# Altium integrated library OneBox.IntLib: 172 symbols (part 2 of 2)
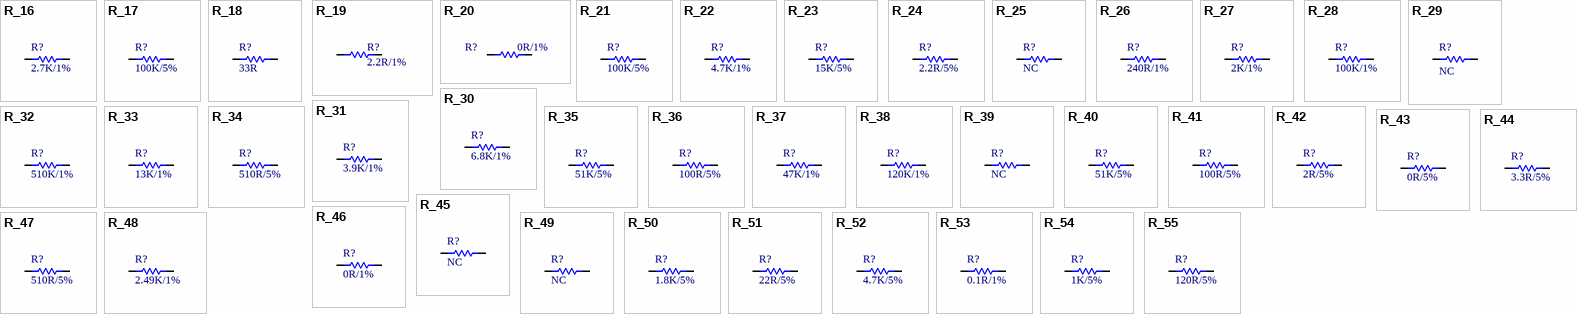
[diagram p11: symbols R_16 to R_55]

## R_31
designator R?, comment 3.9K/1%
1% R0201; BOM名称: 贴片电阻
footprint R0201_M (1/20W贴片电阻)
footprint R0201_NS (1/20W贴片电阻-无丝印)
footprint R0402_M (1/16W贴片电阻)
footprint R0402_NS (1/16W贴片电阻-无丝印)
footprint R0603_M (1/10W贴片电阻)
footprint R0603_NS (1/10W贴片电阻-无丝印)
footprint R0805_NS (1/8W贴片电阻-无丝印)
footprint R0805_M (1/8W贴片电阻)
footprint R01005_NS (1/32W贴片电阻-无丝印)
footprint R1206_M (1/4W贴片电阻)
footprint R1210_M (1/3W贴片电阻)
footprint R1206_NS (1/4W贴片电阻-无丝印)
footprint R1210_NS (1/3W贴片电阻)
footprint R1812_M (1/2W贴片电阻)
footprint R2010_M (3/4W贴片电阻)
footprint R2512_M (1W贴片电阻)
pins: 1, 2

## R_32
designator R?, comment 510K/1%
1% R0201; BOM名称: 贴片电阻
footprint R0201_M (1/20W贴片电阻)
footprint R0201_NS (1/20W贴片电阻-无丝印)
footprint R0402_M (1/16W贴片电阻)
footprint R0402_NS (1/16W贴片电阻-无丝印)
footprint R0603_M (1/10W贴片电阻)
footprint R0603_NS (1/10W贴片电阻-无丝印)
footprint R0805_NS (1/8W贴片电阻-无丝印)
footprint R0805_M (1/8W贴片电阻)
footprint R01005_NS (1/32W贴片电阻-无丝印)
footprint R1206_M (1/4W贴片电阻)
footprint R1210_M (1/3W贴片电阻)
footprint R1206_NS (1/4W贴片电阻-无丝印)
footprint R1210_NS (1/3W贴片电阻)
footprint R1812_M (1/2W贴片电阻)
footprint R2010_M (3/4W贴片电阻)
footprint R2512_M (1W贴片电阻)
pins: 1, 2

## R_33
designator R?, comment 13K/1%
1% R0201; BOM名称: 贴片电阻
footprint R0201_M (1/20W贴片电阻)
footprint R0201_NS (1/20W贴片电阻-无丝印)
footprint R0402_M (1/16W贴片电阻)
footprint R0402_NS (1/16W贴片电阻-无丝印)
footprint R0603_M (1/10W贴片电阻)
footprint R0603_NS (1/10W贴片电阻-无丝印)
footprint R0805_NS (1/8W贴片电阻-无丝印)
footprint R0805_M (1/8W贴片电阻)
footprint R01005_NS (1/32W贴片电阻-无丝印)
footprint R1206_M (1/4W贴片电阻)
footprint R1210_M (1/3W贴片电阻)
footprint R1206_NS (1/4W贴片电阻-无丝印)
footprint R1210_NS (1/3W贴片电阻)
footprint R1812_M (1/2W贴片电阻)
footprint R2010_M (3/4W贴片电阻)
footprint R2512_M (1W贴片电阻)
pins: 1, 2

## R_34
designator R?, comment 510R/5%
5% R0201; BOM名称: 贴片电阻
footprint R0201_M (1/20W贴片电阻)
footprint R0201_NS (1/20W贴片电阻-无丝印)
footprint R0402_M (1/16W贴片电阻)
footprint R0402_NS (1/16W贴片电阻-无丝印)
footprint R0603_M (1/10W贴片电阻)
footprint R0603_NS (1/10W贴片电阻-无丝印)
footprint R0805_NS (1/8W贴片电阻-无丝印)
footprint R0805_M (1/8W贴片电阻)
footprint R01005_NS (1/32W贴片电阻-无丝印)
footprint R1206_M (1/4W贴片电阻)
footprint R1210_M (1/3W贴片电阻)
footprint R1206_NS (1/4W贴片电阻-无丝印)
footprint R1210_NS (1/3W贴片电阻)
footprint R1812_M (1/2W贴片电阻)
footprint R2010_M (3/4W贴片电阻)
footprint R2512_M (1W贴片电阻)
pins: 1, 2

## R_35
designator R?, comment 51K/5%
5% R0201; BOM名称: 贴片电阻
footprint R0201_M (1/20W贴片电阻)
footprint R0201_NS (1/20W贴片电阻-无丝印)
footprint R0402_M (1/16W贴片电阻)
footprint R0402_NS (1/16W贴片电阻-无丝印)
footprint R0603_M (1/10W贴片电阻)
footprint R0603_NS (1/10W贴片电阻-无丝印)
footprint R0805_NS (1/8W贴片电阻-无丝印)
footprint R0805_M (1/8W贴片电阻)
footprint R01005_NS (1/32W贴片电阻-无丝印)
footprint R1206_M (1/4W贴片电阻)
footprint R1210_M (1/3W贴片电阻)
footprint R1206_NS (1/4W贴片电阻-无丝印)
footprint R1210_NS (1/3W贴片电阻)
footprint R1812_M (1/2W贴片电阻)
footprint R2010_M (3/4W贴片电阻)
footprint R2512_M (1W贴片电阻)
pins: 1, 2

## R_36
designator R?, comment 100R/5%
5% R0201; BOM名称: 贴片电阻
footprint R0201_M (1/20W贴片电阻)
footprint R0201_NS (1/20W贴片电阻-无丝印)
footprint R0402_M (1/16W贴片电阻)
footprint R0402_NS (1/16W贴片电阻-无丝印)
footprint R0603_M (1/10W贴片电阻)
footprint R0603_NS (1/10W贴片电阻-无丝印)
footprint R0805_NS (1/8W贴片电阻-无丝印)
footprint R0805_M (1/8W贴片电阻)
footprint R01005_NS (1/32W贴片电阻-无丝印)
footprint R1206_M (1/4W贴片电阻)
footprint R1210_M (1/3W贴片电阻)
footprint R1206_NS (1/4W贴片电阻-无丝印)
footprint R1210_NS (1/3W贴片电阻)
footprint R1812_M (1/2W贴片电阻)
footprint R2010_M (3/4W贴片电阻)
footprint R2512_M (1W贴片电阻)
pins: 1, 2

## R_37
designator R?, comment 47K/1%
1% R0201; BOM名称: 贴片电阻
footprint R0201_M (1/20W贴片电阻)
footprint R0201_NS (1/20W贴片电阻-无丝印)
footprint R0402_M (1/16W贴片电阻)
footprint R0402_NS (1/16W贴片电阻-无丝印)
footprint R0603_M (1/10W贴片电阻)
footprint R0603_NS (1/10W贴片电阻-无丝印)
footprint R0805_NS (1/8W贴片电阻-无丝印)
footprint R0805_M (1/8W贴片电阻)
footprint R01005_NS (1/32W贴片电阻-无丝印)
footprint R1206_M (1/4W贴片电阻)
footprint R1210_M (1/3W贴片电阻)
footprint R1206_NS (1/4W贴片电阻-无丝印)
footprint R1210_NS (1/3W贴片电阻)
footprint R1812_M (1/2W贴片电阻)
footprint R2010_M (3/4W贴片电阻)
footprint R2512_M (1W贴片电阻)
pins: 1, 2

## R_38
designator R?, comment 120K/1%
1% R0201; BOM名称: 贴片电阻
footprint R0201_M (1/20W贴片电阻)
footprint R0201_NS (1/20W贴片电阻-无丝印)
footprint R0402_M (1/16W贴片电阻)
footprint R0402_NS (1/16W贴片电阻-无丝印)
footprint R0603_M (1/10W贴片电阻)
footprint R0603_NS (1/10W贴片电阻-无丝印)
footprint R0805_NS (1/8W贴片电阻-无丝印)
footprint R0805_M (1/8W贴片电阻)
footprint R01005_NS (1/32W贴片电阻-无丝印)
footprint R1206_M (1/4W贴片电阻)
footprint R1210_M (1/3W贴片电阻)
footprint R1206_NS (1/4W贴片电阻-无丝印)
footprint R1210_NS (1/3W贴片电阻)
footprint R1812_M (1/2W贴片电阻)
footprint R2010_M (3/4W贴片电阻)
footprint R2512_M (1W贴片电阻)
pins: 1, 2

## R_39
designator R?, comment NC
1% R0201; BOM名称: 贴片电阻
footprint R0201_M (1/20W贴片电阻)
footprint R0201_NS (1/20W贴片电阻-无丝印)
footprint R0402_M (1/16W贴片电阻)
footprint R0402_NS (1/16W贴片电阻-无丝印)
footprint R0603_M (1/10W贴片电阻)
footprint R0603_NS (1/10W贴片电阻-无丝印)
footprint R0805_NS (1/8W贴片电阻-无丝印)
footprint R0805_M (1/8W贴片电阻)
footprint R01005_NS (1/32W贴片电阻-无丝印)
footprint R1206_M (1/4W贴片电阻)
footprint R1210_M (1/3W贴片电阻)
footprint R1206_NS (1/4W贴片电阻-无丝印)
footprint R1210_NS (1/3W贴片电阻)
footprint R1812_M (1/2W贴片电阻)
footprint R2010_M (3/4W贴片电阻)
footprint R2512_M (1W贴片电阻)
pins: 1, 2

## R_40
designator R?, comment 51K/5%
5% R0402; BOM名称: 贴片电阻
footprint R0201_M (1/20W贴片电阻)
footprint R0201_NS (1/20W贴片电阻-无丝印)
footprint R0402_M (1/16W贴片电阻)
footprint R0402_NS (1/16W贴片电阻-无丝印)
footprint R0603_M (1/10W贴片电阻)
footprint R0603_NS (1/10W贴片电阻-无丝印)
footprint R0805_NS (1/8W贴片电阻-无丝印)
footprint R0805_M (1/8W贴片电阻)
footprint R01005_NS (1/32W贴片电阻-无丝印)
footprint R1206_M (1/4W贴片电阻)
footprint R1210_M (1/3W贴片电阻)
footprint R1206_NS (1/4W贴片电阻-无丝印)
footprint R1210_NS (1/3W贴片电阻)
footprint R1812_M (1/2W贴片电阻)
footprint R2010_M (3/4W贴片电阻)
footprint R2512_M (1W贴片电阻)
pins: 1, 2

## R_41
designator R?, comment 100R/5%
5% R0402; BOM名称: 贴片电阻
footprint R0201_M (1/20W贴片电阻)
footprint R0201_NS (1/20W贴片电阻-无丝印)
footprint R0402_M (1/16W贴片电阻)
footprint R0402_NS (1/16W贴片电阻-无丝印)
footprint R0603_M (1/10W贴片电阻)
footprint R0603_NS (1/10W贴片电阻-无丝印)
footprint R0805_NS (1/8W贴片电阻-无丝印)
footprint R0805_M (1/8W贴片电阻)
footprint R01005_NS (1/32W贴片电阻-无丝印)
footprint R1206_M (1/4W贴片电阻)
footprint R1210_M (1/3W贴片电阻)
footprint R1206_NS (1/4W贴片电阻-无丝印)
footprint R1210_NS (1/3W贴片电阻)
footprint R1812_M (1/2W贴片电阻)
footprint R2010_M (3/4W贴片电阻)
footprint R2512_M (1W贴片电阻)
pins: 1, 2

## R_42
designator R?, comment 2R/5%
5% R1210; BOM名称: 贴片电阻
footprint R0201_M (1/20W贴片电阻)
footprint R0201_NS (1/20W贴片电阻-无丝印)
footprint R0402_M (1/16W贴片电阻)
footprint R0402_NS (1/16W贴片电阻-无丝印)
footprint R0603_M (1/10W贴片电阻)
footprint R0603_NS (1/10W贴片电阻-无丝印)
footprint R0805_NS (1/8W贴片电阻-无丝印)
footprint R0805_M (1/8W贴片电阻)
footprint R01005_NS (1/32W贴片电阻-无丝印)
footprint R1206_M (1/4W贴片电阻)
footprint R1210_M (1/3W贴片电阻)
footprint R1206_NS (1/4W贴片电阻-无丝印)
footprint R1210_NS (1/3W贴片电阻)
footprint R1812_M (1/2W贴片电阻)
footprint R2010_M (3/4W贴片电阻)
footprint R2512_M (1W贴片电阻)
pins: 1, 2

## R_43
designator R?, comment 0R/5%
5% R1206; BOM名称: 贴片电阻
footprint R0201_M (1/20W贴片电阻)
footprint R0201_NS (1/20W贴片电阻-无丝印)
footprint R0402_M (1/16W贴片电阻)
footprint R0402_NS (1/16W贴片电阻-无丝印)
footprint R0603_M (1/10W贴片电阻)
footprint R0603_NS (1/10W贴片电阻-无丝印)
footprint R0805_NS (1/8W贴片电阻-无丝印)
footprint R0805_M (1/8W贴片电阻)
footprint R01005_NS (1/32W贴片电阻-无丝印)
footprint R1206_M (1/4W贴片电阻)
footprint R1210_M (1/3W贴片电阻)
footprint R1206_NS (1/4W贴片电阻-无丝印)
footprint R1210_NS (1/3W贴片电阻)
footprint R1812_M (1/2W贴片电阻)
footprint R2010_M (3/4W贴片电阻)
footprint R2512_M (1W贴片电阻)
pins: 1, 2

## R_44
designator R?, comment 3.3R/5%
5% R0402; BOM名称: 贴片电阻
footprint R0201_M (1/20W贴片电阻)
footprint R0201_NS (1/20W贴片电阻-无丝印)
footprint R0402_M (1/16W贴片电阻)
footprint R0402_NS (1/16W贴片电阻-无丝印)
footprint R0603_M (1/10W贴片电阻)
footprint R0603_NS (1/10W贴片电阻-无丝印)
footprint R0805_NS (1/8W贴片电阻-无丝印)
footprint R0805_M (1/8W贴片电阻)
footprint R01005_NS (1/32W贴片电阻-无丝印)
footprint R1206_M (1/4W贴片电阻)
footprint R1210_M (1/3W贴片电阻)
footprint R1206_NS (1/4W贴片电阻-无丝印)
footprint R1210_NS (1/3W贴片电阻)
footprint R1812_M (1/2W贴片电阻)
footprint R2010_M (3/4W贴片电阻)
footprint R2512_M (1W贴片电阻)
pins: 1, 2

## R_45
designator R?, comment NC
5% R0603 10K; BOM名称: 贴片电阻
footprint R0201_M (1/20W贴片电阻)
footprint R0201_NS (1/20W贴片电阻-无丝印)
footprint R0402_M (1/16W贴片电阻)
footprint R0402_NS (1/16W贴片电阻-无丝印)
footprint R0603_M (1/10W贴片电阻)
footprint R0603_NS (1/10W贴片电阻-无丝印)
footprint R0805_NS (1/8W贴片电阻-无丝印)
footprint R0805_M (1/8W贴片电阻)
footprint R01005_NS (1/32W贴片电阻-无丝印)
footprint R1206_M (1/4W贴片电阻)
footprint R1210_M (1/3W贴片电阻)
footprint R1206_NS (1/4W贴片电阻-无丝印)
footprint R1210_NS (1/3W贴片电阻)
footprint R1812_M (1/2W贴片电阻)
footprint R2010_M (3/4W贴片电阻)
footprint R2512_M (1W贴片电阻)
pins: 1, 2

## R_46
designator R?, comment 0R/1%
1% R1210; BOM名称: 贴片电阻
footprint R0201_M (1/20W贴片电阻)
footprint R0201_NS (1/20W贴片电阻-无丝印)
footprint R0402_M (1/16W贴片电阻)
footprint R0402_NS (1/16W贴片电阻-无丝印)
footprint R0603_M (1/10W贴片电阻)
footprint R0603_NS (1/10W贴片电阻-无丝印)
footprint R0805_NS (1/8W贴片电阻-无丝印)
footprint R0805_M (1/8W贴片电阻)
footprint R01005_NS (1/32W贴片电阻-无丝印)
footprint R1206_M (1/4W贴片电阻)
footprint R1210_M (1/3W贴片电阻)
footprint R1206_NS (1/4W贴片电阻-无丝印)
footprint R1210_NS (1/3W贴片电阻)
footprint R1812_M (1/2W贴片电阻)
footprint R2010_M (3/4W贴片电阻)
footprint R2512_M (1W贴片电阻)
pins: 1, 2

## R_47
designator R?, comment 510R/5%
5% R0402; BOM名称: 贴片电阻
footprint R0201_M (1/20W贴片电阻)
footprint R0201_NS (1/20W贴片电阻-无丝印)
footprint R0402_M (1/16W贴片电阻)
footprint R0402_NS (1/16W贴片电阻-无丝印)
footprint R0603_M (1/10W贴片电阻)
footprint R0603_NS (1/10W贴片电阻-无丝印)
footprint R0805_NS (1/8W贴片电阻-无丝印)
footprint R0805_M (1/8W贴片电阻)
footprint R01005_NS (1/32W贴片电阻-无丝印)
footprint R1206_M (1/4W贴片电阻)
footprint R1210_M (1/3W贴片电阻)
footprint R1206_NS (1/4W贴片电阻-无丝印)
footprint R1210_NS (1/3W贴片电阻)
footprint R1812_M (1/2W贴片电阻)
footprint R2010_M (3/4W贴片电阻)
footprint R2512_M (1W贴片电阻)
pins: 1, 2

## R_48
designator R?, comment 2.49K/1%
1% R0402; BOM名称: 贴片电阻
footprint R0201_M (1/20W贴片电阻)
footprint R0201_NS (1/20W贴片电阻-无丝印)
footprint R0402_M (1/16W贴片电阻)
footprint R0402_NS (1/16W贴片电阻-无丝印)
footprint R0603_M (1/10W贴片电阻)
footprint R0603_NS (1/10W贴片电阻-无丝印)
footprint R0805_NS (1/8W贴片电阻-无丝印)
footprint R0805_M (1/8W贴片电阻)
footprint R01005_NS (1/32W贴片电阻-无丝印)
footprint R1206_M (1/4W贴片电阻)
footprint R1210_M (1/3W贴片电阻)
footprint R1206_NS (1/4W贴片电阻-无丝印)
footprint R1210_NS (1/3W贴片电阻)
footprint R1812_M (1/2W贴片电阻)
footprint R2010_M (3/4W贴片电阻)
footprint R2512_M (1W贴片电阻)
pins: 1, 2

## R_49
designator R?, comment NC
5% R0402 4.7K; BOM名称: 贴片电阻
footprint R0201_M (1/20W贴片电阻)
footprint R0201_NS (1/20W贴片电阻-无丝印)
footprint R0402_M (1/16W贴片电阻)
footprint R0402_NS (1/16W贴片电阻-无丝印)
footprint R0603_M (1/10W贴片电阻)
footprint R0603_NS (1/10W贴片电阻-无丝印)
footprint R0805_NS (1/8W贴片电阻-无丝印)
footprint R0805_M (1/8W贴片电阻)
footprint R01005_NS (1/32W贴片电阻-无丝印)
footprint R1206_M (1/4W贴片电阻)
footprint R1210_M (1/3W贴片电阻)
footprint R1206_NS (1/4W贴片电阻-无丝印)
footprint R1210_NS (1/3W贴片电阻)
footprint R1812_M (1/2W贴片电阻)
footprint R2010_M (3/4W贴片电阻)
footprint R2512_M (1W贴片电阻)
pins: 1, 2

## R_50
designator R?, comment 1.8K/5%
5% R0402; BOM名称: 贴片电阻
footprint R0201_M (1/20W贴片电阻)
footprint R0201_NS (1/20W贴片电阻-无丝印)
footprint R0402_M (1/16W贴片电阻)
footprint R0402_NS (1/16W贴片电阻-无丝印)
footprint R0603_M (1/10W贴片电阻)
footprint R0603_NS (1/10W贴片电阻-无丝印)
footprint R0805_NS (1/8W贴片电阻-无丝印)
footprint R0805_M (1/8W贴片电阻)
footprint R01005_NS (1/32W贴片电阻-无丝印)
footprint R1206_M (1/4W贴片电阻)
footprint R1210_M (1/3W贴片电阻)
footprint R1206_NS (1/4W贴片电阻-无丝印)
footprint R1210_NS (1/3W贴片电阻)
footprint R1812_M (1/2W贴片电阻)
footprint R2010_M (3/4W贴片电阻)
footprint R2512_M (1W贴片电阻)
pins: 1, 2

## R_51
designator R?, comment 22R/5%
5% R0402; BOM名称: 贴片电阻
footprint R0201_M (1/20W贴片电阻)
footprint R0201_NS (1/20W贴片电阻-无丝印)
footprint R0402_M (1/16W贴片电阻)
footprint R0402_NS (1/16W贴片电阻-无丝印)
footprint R0603_M (1/10W贴片电阻)
footprint R0603_NS (1/10W贴片电阻-无丝印)
footprint R0805_NS (1/8W贴片电阻-无丝印)
footprint R0805_M (1/8W贴片电阻)
footprint R01005_NS (1/32W贴片电阻-无丝印)
footprint R1206_M (1/4W贴片电阻)
footprint R1210_M (1/3W贴片电阻)
footprint R1206_NS (1/4W贴片电阻-无丝印)
footprint R1210_NS (1/3W贴片电阻)
footprint R1812_M (1/2W贴片电阻)
footprint R2010_M (3/4W贴片电阻)
footprint R2512_M (1W贴片电阻)
pins: 1, 2

## R_52
designator R?, comment 4.7K/5%
5% R0402; BOM名称: 贴片电阻
footprint R0201_M (1/20W贴片电阻)
footprint R0201_NS (1/20W贴片电阻-无丝印)
footprint R0402_M (1/16W贴片电阻)
footprint R0402_NS (1/16W贴片电阻-无丝印)
footprint R0603_M (1/10W贴片电阻)
footprint R0603_NS (1/10W贴片电阻-无丝印)
footprint R0805_NS (1/8W贴片电阻-无丝印)
footprint R0805_M (1/8W贴片电阻)
footprint R01005_NS (1/32W贴片电阻-无丝印)
footprint R1206_M (1/4W贴片电阻)
footprint R1210_M (1/3W贴片电阻)
footprint R1206_NS (1/4W贴片电阻-无丝印)
footprint R1210_NS (1/3W贴片电阻)
footprint R1812_M (1/2W贴片电阻)
footprint R2010_M (3/4W贴片电阻)
footprint R2512_M (1W贴片电阻)
pins: 1, 2

## R_53
designator R?, comment 0.1R/1%
1% R0603; BOM名称: 贴片电阻
footprint R0201_M (1/20W贴片电阻)
footprint R0201_NS (1/20W贴片电阻-无丝印)
footprint R0402_M (1/16W贴片电阻)
footprint R0402_NS (1/16W贴片电阻-无丝印)
footprint R0603_M (1/10W贴片电阻)
footprint R0603_NS (1/10W贴片电阻-无丝印)
footprint R0805_NS (1/8W贴片电阻-无丝印)
footprint R0805_M (1/8W贴片电阻)
footprint R01005_NS (1/32W贴片电阻-无丝印)
footprint R1206_M (1/4W贴片电阻)
footprint R1210_M (1/3W贴片电阻)
footprint R1206_NS (1/4W贴片电阻-无丝印)
footprint R1210_NS (1/3W贴片电阻)
footprint R1812_M (1/2W贴片电阻)
footprint R2010_M (3/4W贴片电阻)
footprint R2512_M (1W贴片电阻)
pins: 1, 2

## R_54
designator R?, comment 1K/5%
5% R0402; BOM名称: 贴片电阻
footprint R0201_M (1/20W贴片电阻)
footprint R0201_NS (1/20W贴片电阻-无丝印)
footprint R0402_M (1/16W贴片电阻)
footprint R0402_NS (1/16W贴片电阻-无丝印)
footprint R0603_M (1/10W贴片电阻)
footprint R0603_NS (1/10W贴片电阻-无丝印)
footprint R0805_NS (1/8W贴片电阻-无丝印)
footprint R0805_M (1/8W贴片电阻)
footprint R01005_NS (1/32W贴片电阻-无丝印)
footprint R1206_M (1/4W贴片电阻)
footprint R1210_M (1/3W贴片电阻)
footprint R1206_NS (1/4W贴片电阻-无丝印)
footprint R1210_NS (1/3W贴片电阻)
footprint R1812_M (1/2W贴片电阻)
footprint R2010_M (3/4W贴片电阻)
footprint R2512_M (1W贴片电阻)
pins: 1, 2

## R_55
designator R?, comment 120R/5%
5% R0402; BOM名称: 贴片电阻
footprint R0201_M (1/20W贴片电阻)
footprint R0201_NS (1/20W贴片电阻-无丝印)
footprint R0402_M (1/16W贴片电阻)
footprint R0402_NS (1/16W贴片电阻-无丝印)
footprint R0603_M (1/10W贴片电阻)
footprint R0603_NS (1/10W贴片电阻-无丝印)
footprint R0805_NS (1/8W贴片电阻-无丝印)
footprint R0805_M (1/8W贴片电阻)
footprint R01005_NS (1/32W贴片电阻-无丝印)
footprint R1206_M (1/4W贴片电阻)
footprint R1210_M (1/3W贴片电阻)
footprint R1206_NS (1/4W贴片电阻-无丝印)
footprint R1210_NS (1/3W贴片电阻)
footprint R1812_M (1/2W贴片电阻)
footprint R2010_M (3/4W贴片电阻)
footprint R2512_M (1W贴片电阻)
pins: 1, 2

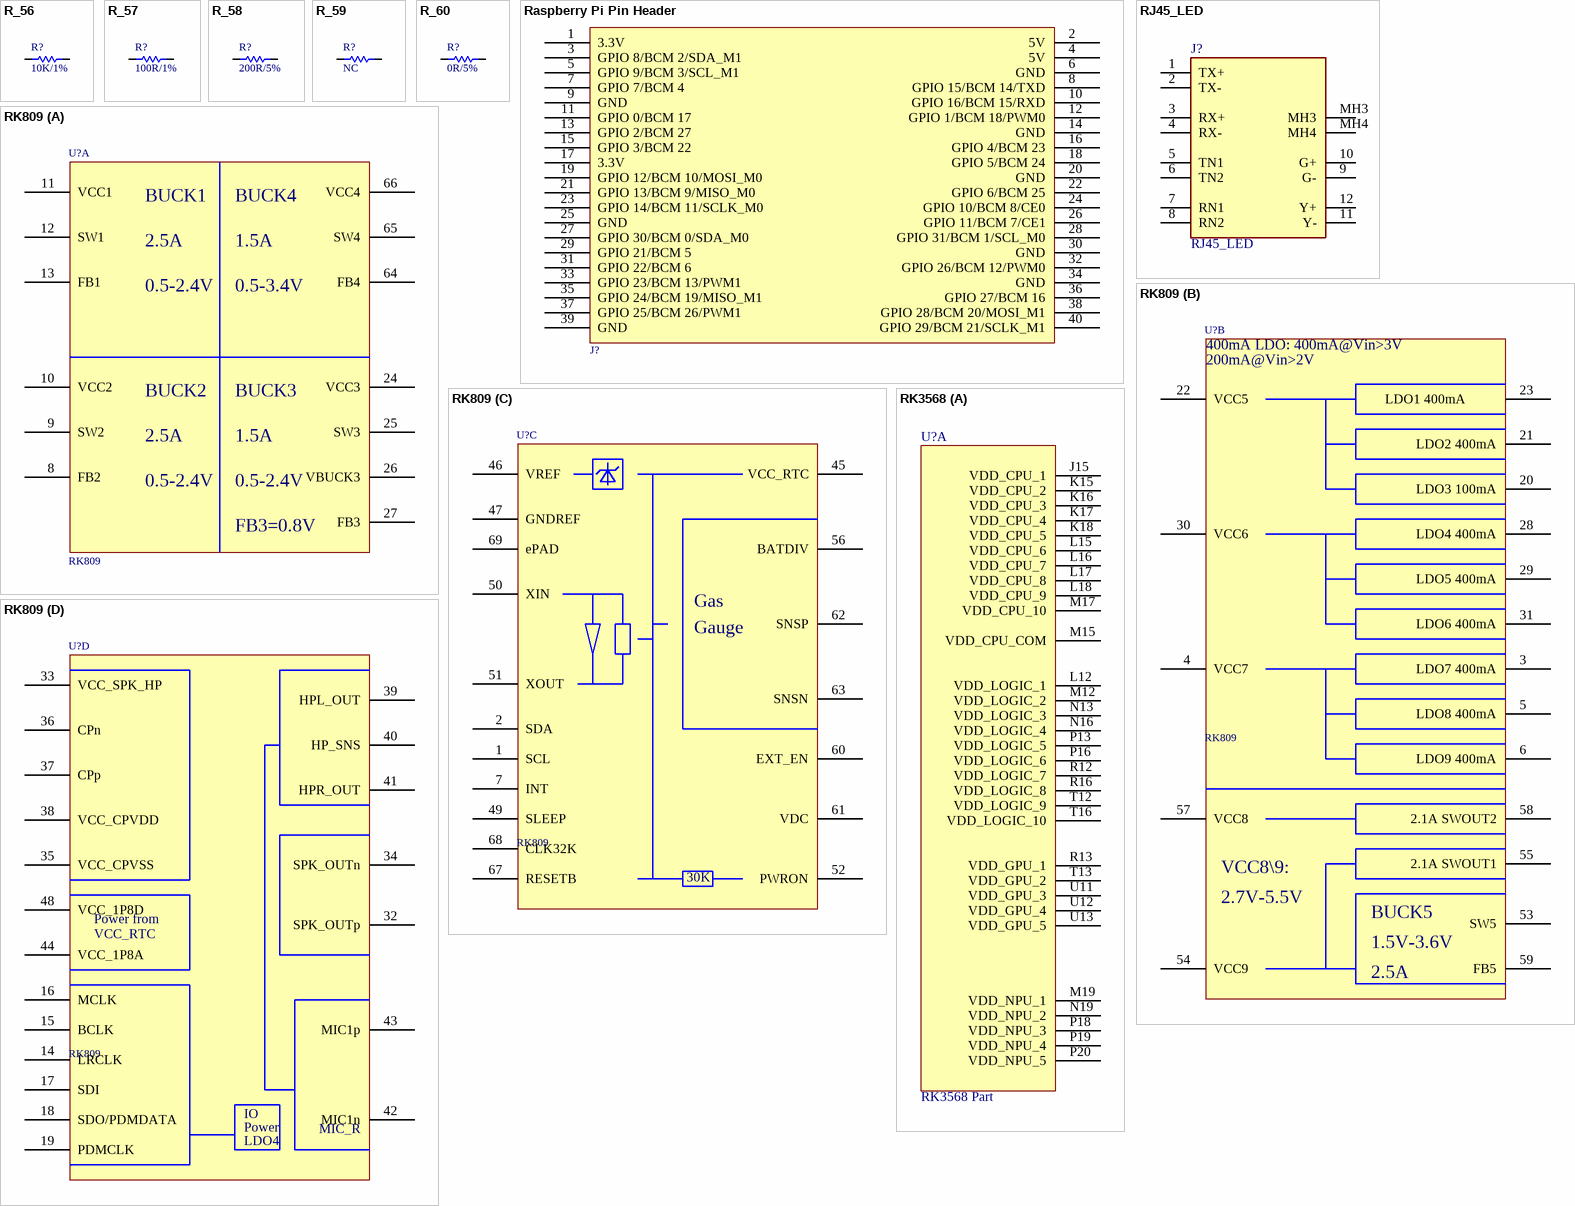
[diagram p4: symbols R_56 to RK3568]

## R_56
designator R?, comment 10K/1%
1% R0402; BOM名称: 贴片电阻
footprint R0201_M (1/20W贴片电阻)
footprint R0201_NS (1/20W贴片电阻-无丝印)
footprint R0402_M (1/16W贴片电阻)
footprint R0402_NS (1/16W贴片电阻-无丝印)
footprint R0603_M (1/10W贴片电阻)
footprint R0603_NS (1/10W贴片电阻-无丝印)
footprint R0805_NS (1/8W贴片电阻-无丝印)
footprint R0805_M (1/8W贴片电阻)
footprint R01005_NS (1/32W贴片电阻-无丝印)
footprint R1206_M (1/4W贴片电阻)
footprint R1210_M (1/3W贴片电阻)
footprint R1206_NS (1/4W贴片电阻-无丝印)
footprint R1210_NS (1/3W贴片电阻)
footprint R1812_M (1/2W贴片电阻)
footprint R2010_M (3/4W贴片电阻)
footprint R2512_M (1W贴片电阻)
pins: 1, 2

## R_57
designator R?, comment 100R/1%
1% R0402; BOM名称: 贴片电阻
footprint R0201_M (1/20W贴片电阻)
footprint R0201_NS (1/20W贴片电阻-无丝印)
footprint R0402_M (1/16W贴片电阻)
footprint R0402_NS (1/16W贴片电阻-无丝印)
footprint R0603_M (1/10W贴片电阻)
footprint R0603_NS (1/10W贴片电阻-无丝印)
footprint R0805_NS (1/8W贴片电阻-无丝印)
footprint R0805_M (1/8W贴片电阻)
footprint R01005_NS (1/32W贴片电阻-无丝印)
footprint R1206_M (1/4W贴片电阻)
footprint R1210_M (1/3W贴片电阻)
footprint R1206_NS (1/4W贴片电阻-无丝印)
footprint R1210_NS (1/3W贴片电阻)
footprint R1812_M (1/2W贴片电阻)
footprint R2010_M (3/4W贴片电阻)
footprint R2512_M (1W贴片电阻)
pins: 1, 2

## R_58
designator R?, comment 200R/5%
5% R0201; BOM名称: 贴片电阻
footprint R0201_M (1/20W贴片电阻)
footprint R0201_NS (1/20W贴片电阻-无丝印)
footprint R0402_M (1/16W贴片电阻)
footprint R0402_NS (1/16W贴片电阻-无丝印)
footprint R0603_M (1/10W贴片电阻)
footprint R0603_NS (1/10W贴片电阻-无丝印)
footprint R0805_NS (1/8W贴片电阻-无丝印)
footprint R0805_M (1/8W贴片电阻)
footprint R01005_NS (1/32W贴片电阻-无丝印)
footprint R1206_M (1/4W贴片电阻)
footprint R1210_M (1/3W贴片电阻)
footprint R1206_NS (1/4W贴片电阻-无丝印)
footprint R1210_NS (1/3W贴片电阻)
footprint R1812_M (1/2W贴片电阻)
footprint R2010_M (3/4W贴片电阻)
footprint R2512_M (1W贴片电阻)
pins: 1, 2

## R_59
designator R?, comment NC
1% R0402; BOM名称: 贴片电阻
footprint R0201_M (1/20W贴片电阻)
footprint R0201_NS (1/20W贴片电阻-无丝印)
footprint R0402_M (1/16W贴片电阻)
footprint R0402_NS (1/16W贴片电阻-无丝印)
footprint R0603_M (1/10W贴片电阻)
footprint R0603_NS (1/10W贴片电阻-无丝印)
footprint R0805_NS (1/8W贴片电阻-无丝印)
footprint R0805_M (1/8W贴片电阻)
footprint R01005_NS (1/32W贴片电阻-无丝印)
footprint R1206_M (1/4W贴片电阻)
footprint R1210_M (1/3W贴片电阻)
footprint R1206_NS (1/4W贴片电阻-无丝印)
footprint R1210_NS (1/3W贴片电阻)
footprint R1812_M (1/2W贴片电阻)
footprint R2010_M (3/4W贴片电阻)
footprint R2512_M (1W贴片电阻)
pins: 1, 2

## R_60
designator R?, comment 0R/5%
5% R0805 4A; BOM名称: 贴片电阻
footprint R0201_M (1/20W贴片电阻)
footprint R0201_NS (1/20W贴片电阻-无丝印)
footprint R0402_M (1/16W贴片电阻)
footprint R0402_NS (1/16W贴片电阻-无丝印)
footprint R0603_M (1/10W贴片电阻)
footprint R0603_NS (1/10W贴片电阻-无丝印)
footprint R0805_NS (1/8W贴片电阻-无丝印)
footprint R0805_M (1/8W贴片电阻)
footprint R01005_NS (1/32W贴片电阻-无丝印)
footprint R1206_M (1/4W贴片电阻)
footprint R1210_M (1/3W贴片电阻)
footprint R1206_NS (1/4W贴片电阻-无丝印)
footprint R1210_NS (1/3W贴片电阻)
footprint R1812_M (1/2W贴片电阻)
footprint R2010_M (3/4W贴片电阻)
footprint R2512_M (1W贴片电阻)
pins: 1, 2

## Raspberry Pi Pin Header
designator J?, comment Header 2X11  (value not drawn)
20*2P接插件; 版权归属: 源创客; BOM名称: 20*2P接插件; 学习资源: www.ooocke.com
footprint HDR2.54-LI-2x20P (双排排针，20x2脚)
pins: 1 3.3V, 2 5V, 3 GPIO 8/BCM 2/SDA_M1, 4 5V, 5 GPIO 9/BCM 3/SCL_M1, 6 GND, 7 GPIO 7/BCM 4, 8 GPIO 15/BCM 14/TXD, 9 GND, 10 GPIO 16/BCM 15/RXD, 11 GPIO 0/BCM 17, 12 GPIO 1/BCM 18/PWM0, 13 GPIO 2/BCM 27, 14 GND, 15 GPIO 3/BCM 22, 16 GPIO 4/BCM 23, 17 3.3V, 18 GPIO 5/BCM 24, 19 GPIO 12/BCM 10/MOSI_M0, 20 GND, 21 GPIO 13/BCM 9/MISO_M0, 22 GPIO 6/BCM 25, 23 GPIO 14/BCM 11/SCLK_M0, 24 GPIO 10/BCM 8/CE0, 25 GND, 26 GPIO 11/BCM 7/CE1, 27 GPIO 30/BCM 0/SDA_M0, 28 GPIO 31/BCM 1/SCL_M0, 29 GPIO 21/BCM 5, 30 GND, 31 GPIO 22/BCM 6, 32 GPIO 26/BCM 12/PWM0, 33 GPIO 23/BCM 13/PWM1, 34 GND, 35 GPIO 24/BCM 19/MISO_M1, 36 GPIO 27/BCM 16, 37 GPIO 25/BCM 26/PWM1, 38 GPIO 28/BCM 20/MOSI_M1, 39 GND, 40 GPIO 29/BCM 21/SCLK_M1

## RJ45_LED
designator J?
Connector; Manufacturer_Name: Amphenol; Manufacturer_Part_Number: RJHSE3381A1; Datasheet Link: https://componentsearchengine.com//RJHSE3381A1.pdf; Height: 15.88mm; Mouser2 Part Number: 523-RJHSE3381A1; Mouser2 Price/Stock: https://www.mouser.com/Search/Refine.aspx?Keyword=523-RJHSE3381A1
footprint RJ45-180
footprint RJ-45A12 (网线接口)
footprint RJ45-2LED (RJ45屏蔽网络插座带LED)
pins: 1 TX+, 2 TX-, 3 RX+, 4 RX-, 5 TN1, 6 TN2, 7 RN1, 8 RN2, 9 G-, 10 G+, 11 Y-, 12 Y+, MH3, MH4

## RK809
designator U?
footprint QFN68 7x7 (68脚，长x宽x高：7x7x0.85mm，脚距：0.35mm)
part A pins: 8 FB2, 9 SW2, 10 VCC2, 11 VCC1, 12 SW1, 13 FB1, 24 VCC3, 25 SW3, 26 VBUCK3, 27 FB3, 64 FB4, 65 SW4, 66 VCC4
part B pins: 3 LDO7 400mA, 4 VCC7, 5 LDO8 400mA, 6 LDO9 400mA, 20 LDO3 100mA, 21 LDO2 400mA, 22 VCC5, 23 LDO1 400mA         , 28 LDO4 400mA, 29 LDO5 400mA, 30 VCC6, 31 LDO6 400mA, 53 SW5, 54 VCC9, 55 2.1A SWOUT1, 57 VCC8, 58 2.1A SWOUT2, 59 FB5
part C pins: 1 SCL, 2 SDA, 7 INT, 45 VCC_RTC, 46 VREF, 47 GNDREF, 49 SLEEP, 50 XIN, 51 XOUT, 52 PWRON, 56 BATDIV, 60 EXT_EN, 61 VDC, 62 SNSP, 63 SNSN, 67 RESETB, 68 CLK32K, 69 ePAD
part D pins: 14 LRCLK, 15 BCLK, 16 MCLK, 17 SDI, 18 SDO/PDMDATA, 19 PDMCLK, 32 SPK_OUTp, 33 VCC_SPK_HP, 34 SPK_OUTn, 35 VCC_CPVSS, 36 CPn, 37 CPp, 38 VCC_CPVDD, 39 HPL_OUT, 40 HP_SNS, 41 HPR_OUT, 42 MIC1n, 43 MIC1p, 44 VCC_1P8A, 48 VCC_1P8D

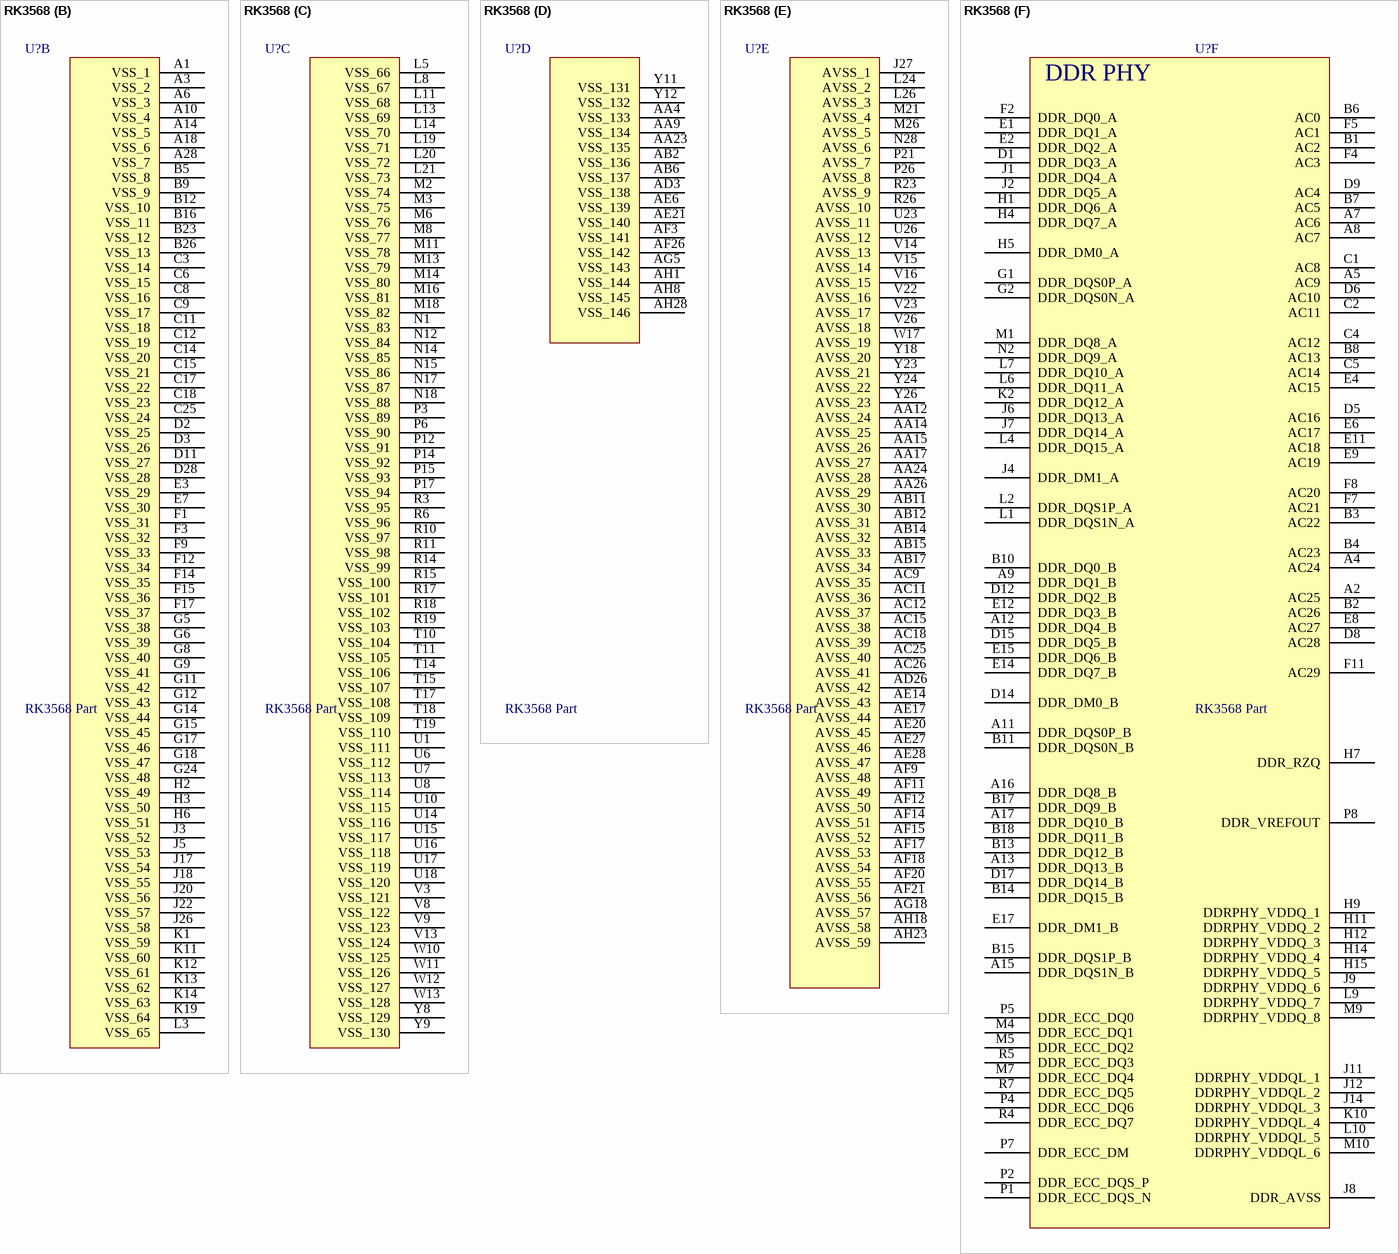
[diagram p5: symbol RK3568]

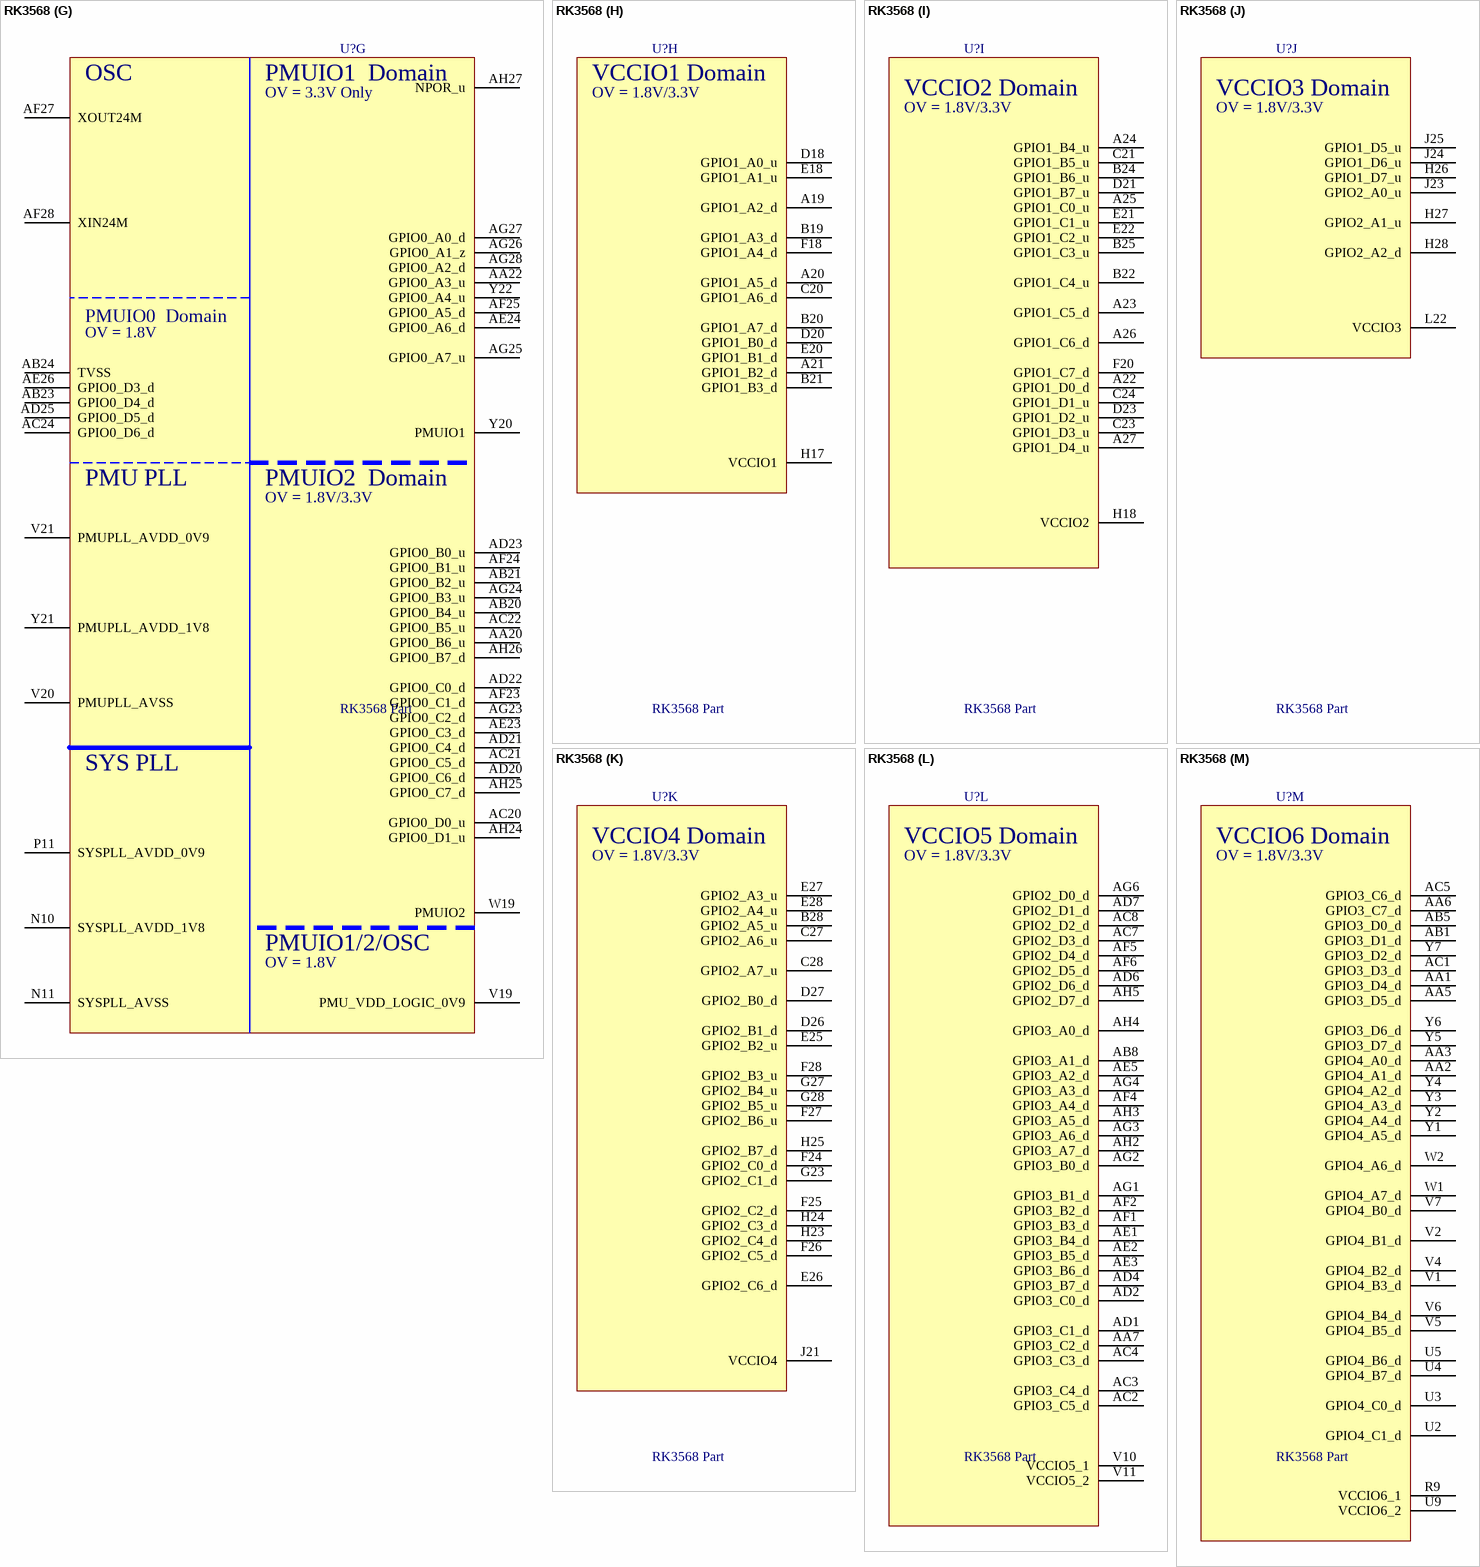
[diagram p6: symbol RK3568]
